# Altium footprint library HARTING THD.PcbLib: 113 footprints (part 9 of 11) (continued)
## HARTING_09 73 196 6904 [mm] "DIN 41612, Type R, 96 Position, Rows a+b+c, Performance level 2, Press-in Lead 5.0 mm, Pitch 2.54mm, Straight Male Connector" (continued)
Mechanical 14:
  circle w0.1: c2.24,-84.37 r1.4
  circle w0.1: c2.24,5.63 r1.4
  lines w0.1: -0.775,-86.87 -0.775,-84.37 0.755,-81.72 3.725,-81.72 5.255,-84.37 5.255,-86.87 ; -0.775,8.13 -0.775,5.63 0.755,2.98 3.725,2.98 5.255,5.63 5.255,8.13 ; 0.206,3.93 -2.46,3.93 ; 0.264,-82.57 -2.46,-82.57 ; 0.582,3.28 -1.81,3.28 -1.81,-81.92 0.64,-81.92 ; 3.84,-81.92 4.49,-81.92 4.49,-80.97 6.89,-80.97 6.89,2.33 4.49,2.33 4.49,3.28 3.898,3.28 ; 4.216,-82.57 5.14,-82.57 5.14,-81.62 7.54,-81.62 ; 4.274,3.93 5.14,3.93 ; -2.46,-82.57 -1.36,-81.47 ; -2.46,-82.57 -2.46,3.93 ; -2.46,3.93 -1.36,2.83 ; -1.36,-81.47 -1.36,2.83 ; -1.36,-81.47 4.04,-81.47 4.04,-80.52 6.44,-80.52 ; -1.36,2.83 4.04,2.83 ; 4.04,2.83 5.14,3.93 ; 4.04,2.83 4.04,1.88 6.44,1.88 ; 5.14,3.93 5.14,2.98 7.54,2.98 ; 6.44,-80.52 7.54,-81.62 ; 6.44,-80.52 6.44,1.88 ; 6.44,1.88 7.54,2.98 ; 7.54,-81.62 7.54,2.98 ; -3.01,-83.32 -1.835,-83.32 -1.835,-86.87 6.915,-86.87 6.915,-83.32 8.09,-83.32 8.09,4.58 6.915,4.58 6.915,8.13 -1.835,8.13 -1.835,4.58 -3.01,4.58 -3.01,-83.32
  text "1" at -4.127,-0.6 h1.2
  text "5" at -4.763,-10.76 h1.2
  text "a" at -0.343,1.387 h1.2
  text "b" at 1.245,1.387 h1.2
  text "c" at 2.832,1.387 h1.2
  text "10" at -5.715,-23.46 h1.2
  text "15" at -5.715,-36.16 h1.2
  text "20" at -5.715,-48.86 h1.2
  text "25" at -5.715,-61.56 h1.2
  text "30" at -5.715,-74.26 h1.2
  text "32" at -5.715,-79.34 h1.2
Drill Drawing:
  lines w0.1: -2.54,-58.42 -2.54,-81.28 7.62,-81.28 7.62,2.54 -2.54,2.54 -2.54,-20.32
  text "PRESS-FIT TECHNOLOGY diam. 1mm +0.1 -0" at -2.05,-55.525 h1
3D body "HARTING_09 73 196 6904.stp": height 11.6, standoff -5, extent -3.01,-86.87 8.09,8.13

## HARTING_09 73 264 6801 [mm] "Connector; DIN 41612, Har-Bus Type R, Thru-Hole; Rows a+c, 64 Position; Right Angle"
height 9.5
pads (66):
  round 1.7 hole 1: a1(0,0) a2(0,-2.54) a3(0,-5.08) a4(0,-7.62) a5(0,-10.16) a6(0,-12.7) a7(0,-15.24) a8(0,-17.78) a9(0,-20.32) a10(0,-22.86) a11(0,-25.4) a12(0,-27.94) a13(0,-30.48) a14(0,-33.02) a15(0,-35.56) a16(0,-38.1) a17(0,-40.64) a18(0,-43.18) a19(0,-45.72) a20(0,-48.26) a21(0,-50.8) a22(0,-53.34) a23(0,-55.88) a24(0,-58.42) a25(0,-60.96) a26(0,-63.5) a27(0,-66.04) a28(0,-68.58) a29(0,-71.12) a30(0,-73.66) a31(0,-76.2) a32(0,-78.74) c1(-5.08,0) c2(-5.08,-2.54) c3(-5.08,-5.08) c4(-5.08,-7.62) c5(-5.08,-10.16) c6(-5.08,-12.7) c7(-5.08,-15.24) c8(-5.08,-17.78) c9(-5.08,-20.32) c10(-5.08,-22.86) c11(-5.08,-25.4) c12(-5.08,-27.94) c13(-5.08,-30.48) c14(-5.08,-33.02) c15(-5.08,-35.56) c16(-5.08,-38.1) c17(-5.08,-40.64) c18(-5.08,-43.18) c19(-5.08,-45.72) c20(-5.08,-48.26) c21(-5.08,-50.8) c22(-5.08,-53.34) c23(-5.08,-55.88) c24(-5.08,-58.42) c25(-5.08,-60.96) c26(-5.08,-63.5) c27(-5.08,-66.04) c28(-5.08,-68.58) c29(-5.08,-71.12) c30(-5.08,-73.66) c31(-5.08,-76.2) c32(-5.08,-78.74)
  round 3.5 / inner round 3.5 / far side round 5.1 hole 2.8: MTG1(2.54,5.08) MTG2(2.54,-83.82)
Top Overlay:
  lines w0.2: 1.738,-86.32 0.01,-86.32 0.01,-81.395 1.215,-81.395 1.215,2.655 0.01,2.655 0.01,7.58 1.738,7.58 ; 3.556,-86.32 6.14,-86.32 6.14,-84.003 6.14,5.263 6.14,7.58 3.556,7.58 ; 6.14,-81.845 12.06,-81.845 ; 6.14,-80.795 6.77,-80.795 12.06,-80.795 ; 6.14,2.055 6.77,2.055 12.06,2.055 ; 6.14,3.105 12.06,3.105 ; 12.06,-81.845 12.69,-81.215 12.69,-80.165 ; 12.06,-81.845 12.06,-80.795 ; 12.06,-80.795 12.69,-80.165 ; 12.06,-80.795 12.06,2.055 ; 12.06,2.055 12.69,1.425 ; 12.06,2.055 12.06,3.105 ; 12.06,3.105 12.69,2.475 12.69,1.425 ; 12.69,-80.165 12.69,1.425
  text "5" at -6.895,-10.785 h1.2
  text "1" at -6.695,-0.725 h1.2
  text "30" at -8.12,-74.235 h1.2
  text "10" at -8.02,-23.535 h1.2
  text "32" at -8.12,-79.315 h1.2
  text "25" at -8.1,-61.6 h1.2
  text "c" at -4.58,2.04 h1.2
  text "a" at -0.6,2.04 h1.2
  text "15" at -8.02,-36.235 h1.2
  text "20" at -8.12,-48.835 h1.2
Mechanical 8:
  lines w0.1: -5.08,-39.37 12.64,-39.37 ; 5.3,-86.3 5.3,7.5
Mechanical 14:
  circle w0.1: c2.54,-83.82 r1.4
  circle w0.1: c2.54,5.08 r1.4
  lines w0.1: 1.14,-77.97 5.59,-77.97 ; 1.14,-76.97 5.59,-76.97 ; 1.14,-52.57 5.59,-52.57 ; 1.14,-51.57 5.59,-51.57 ; 1.14,-27.17 5.59,-27.17 ; 1.14,-26.17 5.59,-26.17 ; 1.14,-1.77 5.59,-1.77 ; 1.14,-0.77 5.59,-0.77 ; 1.297,5.08 2.54,5.08 ; 6.14,-81.845 12.06,-81.845 ; 6.14,-80.795 6.77,-80.795 ; 6.14,2.055 6.77,2.055 ; 6.14,3.105 12.06,3.105 ; 1.14,-81.395 1.14,2.655 ; 1.14,-81.395 4.084,-81.395 5.59,-84.003 ; 1.14,-81.395 0.01,-81.395 0.01,-86.32 6.14,-86.32 6.14,-84.003 ; 1.14,2.655 4.084,2.655 5.59,5.263 ; 1.14,2.655 0.01,2.655 0.01,7.58 6.14,7.58 6.14,5.263 ; 5.59,-84.003 5.59,-77.72 1.69,-77.72 1.69,-77.22 5.59,-77.22 5.59,-52.32 1.69,-52.32 1.69,-51.82 5.59,-51.82 5.59,-26.92 1.69,-26.92 1.69,-26.42 5.59,-26.42 5.59,-1.52 1.69,-1.52 1.69,-1.02 5.59,-1.02 5.59,5.263 ; 5.59,-84.003 6.14,-84.003 ; 5.59,5.263 6.14,5.263 ; 6.14,-84.003 6.14,5.263 ; 6.77,-80.795 12.06,-80.795 ; 6.77,-80.795 6.77,2.055 ; 6.77,2.055 12.06,2.055 ; 12.06,-81.845 12.69,-81.215 12.69,-80.165 ; 12.06,-81.845 12.06,-80.795 ; 12.06,-80.795 12.69,-80.165 ; 12.06,-80.795 12.06,2.055 ; 12.06,2.055 12.69,1.425 ; 12.06,2.055 12.06,3.105 ; 12.06,3.105 12.69,2.475 12.69,1.425 ; 12.69,-80.165 12.69,1.425
  text "5" at -6.895,-10.785 h1.2
  text "10" at -8.02,-23.535 h1.2
  text "25" at -8.1,-61.6 h1.2
  text "1" at -6.695,-0.725 h1.2
  text "32" at -8.12,-79.315 h1.2
  text "15" at -8.02,-36.235 h1.2
  text "20" at -8.12,-48.835 h1.2
  text "30" at -8.12,-74.235 h1.2
  text "c" at -4.58,2.04 h1.2
  text "a" at -0.6,2.04 h1.2
3D body "HARTING_09 73 264 6801.stp": height 9.1, standoff -3, extent -5.38,-86.37 12.74,7.63

## HARTING_09 73 296 6801 [mm] "Connector; DIN 41612, Type R, Thru-Hole; Rows a+b+c, 96 Position; Right Angle"
height 9.5
pads (98):
  round 1.7 hole 1: a1(0,0) a2(0,-2.54) a3(0,-5.08) a4(0,-7.62) a5(0,-10.16) a6(0,-12.7) a7(0,-15.24) a8(0,-17.78) a9(0,-20.32) a10(0,-22.86) a11(0,-25.4) a12(0,-27.94) a13(0,-30.48) a14(0,-33.02) a15(0,-35.56) a16(0,-38.1) a17(0,-40.64) a18(0,-43.18) a19(0,-45.72) a20(0,-48.26) a21(0,-50.8) a22(0,-53.34) a23(0,-55.88) a24(0,-58.42) a25(0,-60.96) a26(0,-63.5) a27(0,-66.04) a28(0,-68.58) a29(0,-71.12) a30(0,-73.66) a31(0,-76.2) a32(0,-78.74) b1(-2.54,0) b2(-2.54,-2.54) b3(-2.54,-5.08) b4(-2.54,-7.62) b5(-2.54,-10.16) b6(-2.54,-12.7) b7(-2.54,-15.24) b8(-2.54,-17.78) b9(-2.54,-20.32) b10(-2.54,-22.86) b11(-2.54,-25.4) b12(-2.54,-27.94) b13(-2.54,-30.48) b14(-2.54,-33.02) b15(-2.54,-35.56) b16(-2.54,-38.1) b17(-2.54,-40.64) b18(-2.54,-43.18) b19(-2.54,-45.72) b20(-2.54,-48.26) b21(-2.54,-50.8) b22(-2.54,-53.34) b23(-2.54,-55.88) b24(-2.54,-58.42) b25(-2.54,-60.96) b26(-2.54,-63.5) b27(-2.54,-66.04) b28(-2.54,-68.58) b29(-2.54,-71.12) b30(-2.54,-73.66) b31(-2.54,-76.2) b32(-2.54,-78.74) c1(-5.08,0) c2(-5.08,-2.54) c3(-5.08,-5.08) c4(-5.08,-7.62) c5(-5.08,-10.16) c6(-5.08,-12.7) c7(-5.08,-15.24) c8(-5.08,-17.78) c9(-5.08,-20.32) c10(-5.08,-22.86) c11(-5.08,-25.4) c12(-5.08,-27.94) c13(-5.08,-30.48) c14(-5.08,-33.02) c15(-5.08,-35.56) c16(-5.08,-38.1) c17(-5.08,-40.64) c18(-5.08,-43.18) c19(-5.08,-45.72) c20(-5.08,-48.26) c21(-5.08,-50.8) c22(-5.08,-53.34) c23(-5.08,-55.88) c24(-5.08,-58.42) c25(-5.08,-60.96) c26(-5.08,-63.5) c27(-5.08,-66.04) c28(-5.08,-68.58) c29(-5.08,-71.12) c30(-5.08,-73.66) c31(-5.08,-76.2) c32(-5.08,-78.74)
  round 3.5 / inner round 3.5 / far side round 5.1 hole 2.8: MTG1(2.54,5.08) MTG2(2.54,-83.82)
Top Overlay:
  lines w0.2: 1.738,-86.32 0.01,-86.32 0.01,-81.395 1.19,-81.395 1.19,2.655 0.01,2.655 0.01,7.58 1.738,7.58 ; 3.556,-86.32 6.14,-86.32 6.14,-84.003 6.14,5.263 6.14,7.58 3.556,7.58 ; 6.14,-81.845 12.06,-81.845 ; 6.14,-80.795 6.77,-80.795 12.06,-80.795 ; 6.14,2.055 6.77,2.055 12.06,2.055 ; 6.14,3.105 12.06,3.105 ; 12.06,-81.845 12.06,-80.795 ; 12.06,-81.845 12.69,-81.215 12.69,-80.165 ; 12.06,-80.795 12.06,2.055 ; 12.06,-80.795 12.69,-80.165 ; 12.06,2.055 12.06,3.105 ; 12.06,2.055 12.69,1.425 ; 12.06,3.105 12.69,2.475 12.69,1.425 ; 12.69,-80.165 12.69,1.425
  text "20" at -8.12,-48.835 h1.2
  text "15" at -8.02,-36.235 h1.2
  text "a" at -0.6,2.04 h1.2
  text "b" at -2.04,2.04 h1.2
  text "c" at -4.58,2.04 h1.2
  text "25" at -8.1,-61.6 h1.2
  text "32" at -8.12,-79.315 h1.2
  text "10" at -8.02,-23.535 h1.2
  text "30" at -8.12,-74.235 h1.2
  text "1" at -6.695,-0.725 h1.2
  text "5" at -6.895,-10.785 h1.2
Mechanical 8:
  lines w0.1: -5.08,-39.37 12.64,-39.37 ; 5.3,-86.3 5.3,7.5
Mechanical 14:
  circle w0.1: c2.54,5.08 r1.4
  circle w0.1: c2.54,-83.82 r1.4
  lines w0.1: 1.14,-77.97 5.59,-77.97 ; 1.14,-76.97 5.59,-76.97 ; 1.14,-52.57 5.59,-52.57 ; 1.14,-51.57 5.59,-51.57 ; 1.14,-27.17 5.59,-27.17 ; 1.14,-26.17 5.59,-26.17 ; 1.14,-1.77 5.59,-1.77 ; 1.14,-0.77 5.59,-0.77 ; 1.297,5.08 2.54,5.08 ; 6.14,-81.845 12.06,-81.845 ; 6.14,-80.795 6.77,-80.795 ; 6.14,2.055 6.77,2.055 ; 6.14,3.105 12.06,3.105 ; 1.14,-81.395 0.01,-81.395 0.01,-86.32 6.14,-86.32 6.14,-84.003 ; 1.14,-81.395 4.084,-81.395 5.59,-84.003 ; 1.14,-81.395 1.14,2.655 ; 1.14,2.655 0.01,2.655 0.01,7.58 6.14,7.58 6.14,5.263 ; 1.14,2.655 4.084,2.655 5.59,5.263 ; 5.59,-84.003 6.14,-84.003 ; 5.59,-84.003 5.59,-77.72 1.69,-77.72 1.69,-77.22 5.59,-77.22 5.59,-52.32 1.69,-52.32 1.69,-51.82 5.59,-51.82 5.59,-26.92 1.69,-26.92 1.69,-26.42 5.59,-26.42 5.59,-1.52 1.69,-1.52 1.69,-1.02 5.59,-1.02 5.59,5.263 ; 5.59,5.263 6.14,5.263 ; 6.14,-84.003 6.14,5.263 ; 6.77,-80.795 6.77,2.055 ; 6.77,-80.795 12.06,-80.795 ; 6.77,2.055 12.06,2.055 ; 12.06,-81.845 12.06,-80.795 ; 12.06,-81.845 12.69,-81.215 12.69,-80.165 ; 12.06,-80.795 12.06,2.055 ; 12.06,-80.795 12.69,-80.165 ; 12.06,2.055 12.06,3.105 ; 12.06,2.055 12.69,1.425 ; 12.06,3.105 12.69,2.475 12.69,1.425 ; 12.69,-80.165 12.69,1.425
  text "a" at -0.6,2.04 h1.2
  text "b" at -2.04,2.04 h1.2
  text "c" at -4.58,2.04 h1.2
  text "30" at -8.12,-74.235 h1.2
  text "20" at -8.12,-48.835 h1.2
  text "15" at -8.02,-36.235 h1.2
  text "32" at -8.12,-79.315 h1.2
  text "1" at -6.695,-0.725 h1.2
  text "25" at -8.1,-61.6 h1.2
  text "10" at -8.02,-23.535 h1.2
  text "5" at -6.895,-10.785 h1.2
3D body "HARTING_09 73 296 6801.stp": height 9.1, standoff -3, extent -5.38,-86.37 12.74,7.63

## HARTING_09 73 296 6801_a [mm] "Connector; DIN 41612, Type R, Thru-Hole; Rows a+b+c, 96 Position; Right Angle"
height 9.5
pads (98):
  round 1.7 hole 1: a1(0,0) a2(0,-2.54) a3(0,-5.08) a4(0,-7.62) a5(0,-10.16) a6(0,-12.7) a7(0,-15.24) a8(0,-17.78) a9(0,-20.32) a10(0,-22.86) a11(0,-25.4) a12(0,-27.94) a13(0,-30.48) a14(0,-33.02) a15(0,-35.56) a16(0,-38.1) a17(0,-40.64) a18(0,-43.18) a19(0,-45.72) a20(0,-48.26) a21(0,-50.8) a22(0,-53.34) a23(0,-55.88) a24(0,-58.42) a25(0,-60.96) a26(0,-63.5) a27(0,-66.04) a28(0,-68.58) a29(0,-71.12) a30(0,-73.66) a31(0,-76.2) a32(0,-78.74) b1(2.54,0) b2(2.54,-2.54) b3(2.54,-5.08) b4(2.54,-7.62) b5(2.54,-10.16) b6(2.54,-12.7) b7(2.54,-15.24) b8(2.54,-17.78) b9(2.54,-20.32) b10(2.54,-22.86) b11(2.54,-25.4) b12(2.54,-27.94) b13(2.54,-30.48) b14(2.54,-33.02) b15(2.54,-35.56) b16(2.54,-38.1) b17(2.54,-40.64) b18(2.54,-43.18) b19(2.54,-45.72) b20(2.54,-48.26) b21(2.54,-50.8) b22(2.54,-53.34) b23(2.54,-55.88) b24(2.54,-58.42) b25(2.54,-60.96) b26(2.54,-63.5) b27(2.54,-66.04) b28(2.54,-68.58) b29(2.54,-71.12) b30(2.54,-73.66) b31(2.54,-76.2) b32(2.54,-78.74) c1(5.08,0) c2(5.08,-2.54) c3(5.08,-5.08) c4(5.08,-7.62) c5(5.08,-10.16) c6(5.08,-12.7) c7(5.08,-15.24) c8(5.08,-17.78) c9(5.08,-20.32) c10(5.08,-22.86) c11(5.08,-25.4) c12(5.08,-27.94) c13(5.08,-30.48) c14(5.08,-33.02) c15(5.08,-35.56) c16(5.08,-38.1) c17(5.08,-40.64) c18(5.08,-43.18) c19(5.08,-45.72) c20(5.08,-48.26) c21(5.08,-50.8) c22(5.08,-53.34) c23(5.08,-55.88) c24(5.08,-58.42) c25(5.08,-60.96) c26(5.08,-63.5) c27(5.08,-66.04) c28(5.08,-68.58) c29(5.08,-71.12) c30(5.08,-73.66) c31(5.08,-76.2) c32(5.08,-78.74)
  round 3.5 / inner round 3.5 / far side round 5.1 hole 2.8: MTG1(-2.54,5.08) MTG2(-2.54,-83.82)
Top Overlay:
  lines w0.2: -6.14,-81.845 -12.06,-81.845 ; -6.14,-80.795 -6.77,-80.795 -12.06,-80.795 ; -6.14,2.055 -6.77,2.055 -12.06,2.055 ; -6.14,3.105 -12.06,3.105 ; -3.556,-86.32 -6.14,-86.32 -6.14,-84.003 -6.14,5.263 -6.14,7.58 -3.556,7.58 ; -1.738,-86.32 -0.01,-86.32 -0.01,-81.395 -1.19,-81.395 -1.19,2.655 -0.01,2.655 -0.01,7.58 -1.738,7.58 ; -12.69,-80.165 -12.69,1.425 ; -12.69,-80.165 -12.69,-81.215 -12.06,-81.845 ; -12.69,-80.165 -12.06,-80.795 ; -12.69,1.425 -12.69,2.475 -12.06,3.105 ; -12.69,1.425 -12.06,2.055 ; -12.06,-81.845 -12.06,-80.795 ; -12.06,-80.795 -12.06,2.055 ; -12.06,2.055 -12.06,3.105
  text "20" at 6.38,-48.835 h1.2
  text "15" at 6.48,-36.235 h1.2
  text "25" at 6.4,-61.6 h1.2
  text "32" at 6.38,-79.315 h1.2
  text "10" at 6.48,-23.535 h1.2
  text "30" at 6.38,-74.235 h1.2
  text "1" at 6.705,-0.725 h1.2
  text "5" at 6.505,-10.785 h1.2
  text "c" at 5.6,1.72 h1.2
  text "b" at 3.66,1.72 h1.2
  text "a" at 1.42,1.72 h1.2
Mechanical 8:
  lines w0.1: -12.64,-39.37 5.08,-39.37 ; -5.3,-86.24 -5.3,7.56
  text "Reversed Numbering Version" at -8.4,-71.4 h2.5
Mechanical 14:
  circle w0.1: c-2.54,5.08 r1.4
  circle w0.1: c-2.54,-83.82 r1.4
  lines w0.1: -6.14,-81.845 -12.06,-81.845 ; -6.14,-80.795 -6.77,-80.795 ; -6.14,2.055 -6.77,2.055 ; -6.14,3.105 -12.06,3.105 ; -5.59,-77.97 -1.14,-77.97 ; -5.59,-76.97 -1.14,-76.97 ; -5.59,-52.57 -1.14,-52.57 ; -5.59,-51.57 -1.14,-51.57 ; -5.59,-27.17 -1.14,-27.17 ; -5.59,-26.17 -1.14,-26.17 ; -5.59,-1.77 -1.14,-1.77 ; -5.59,-0.77 -1.14,-0.77 ; -2.54,-83.82 -1.297,-83.82 ; -12.69,-80.165 -12.69,1.425 ; -12.69,-80.165 -12.69,-81.215 -12.06,-81.845 ; -12.69,-80.165 -12.06,-80.795 ; -12.69,1.425 -12.69,2.475 -12.06,3.105 ; -12.69,1.425 -12.06,2.055 ; -12.06,-81.845 -12.06,-80.795 ; -12.06,-80.795 -6.77,-80.795 ; -12.06,-80.795 -12.06,2.055 ; -12.06,2.055 -6.77,2.055 ; -12.06,2.055 -12.06,3.105 ; -6.77,-80.795 -6.77,2.055 ; -6.14,-84.003 -6.14,5.263 ; -6.14,-84.003 -5.59,-84.003 ; -6.14,-84.003 -6.14,-86.32 -0.01,-86.32 -0.01,-81.395 -1.14,-81.395 ; -6.14,5.263 -5.59,5.263 ; -6.14,5.263 -6.14,7.58 -0.01,7.58 -0.01,2.655 -1.14,2.655 ; -5.59,-84.003 -5.59,-77.72 -1.69,-77.72 -1.69,-77.22 -5.59,-77.22 -5.59,-52.32 -1.69,-52.32 -1.69,-51.82 -5.59,-51.82 -5.59,-26.92 -1.69,-26.92 -1.69,-26.42 -5.59,-26.42 -5.59,-1.52 -1.69,-1.52 -1.69,-1.02 -5.59,-1.02 -5.59,5.263 ; -5.59,-84.003 -4.084,-81.395 -1.14,-81.395 ; -5.59,5.263 -4.084,2.655 -1.14,2.655 ; -1.14,-81.395 -1.14,2.655
  text "30" at 6.38,-74.235 h1.2
  text "20" at 6.38,-48.835 h1.2
  text "15" at 6.48,-36.235 h1.2
  text "32" at 6.38,-79.315 h1.2
  text "1" at 6.705,-0.725 h1.2
  text "25" at 6.4,-61.6 h1.2
  text "10" at 6.48,-23.535 h1.2
  text "5" at 6.505,-10.785 h1.2
  text "c" at 5.6,1.72 h1.2
  text "b" at 3.66,1.72 h1.2
  text "a" at 1.42,1.72 h1.2
3D body "HARTING_09 73 296 6801.stp": height 9.1, standoff -3, extent -12.74,-86.37 5.38,7.63

## HARTING_09 79 196 6903 [mm] "DIN 41612, Type RL, 96 Position, Rows a+b+c, Performance level 2, Straight Male Connector, Lead 4.0 mm, Pitch 2.54mm"
height 11.6
pads (98):
  round 1.7 hole 1: a1(0,0) a2(0,-2.54) a3(0,-5.08) a4(0,-7.62) a5(0,-10.16) a6(0,-12.7) a7(0,-15.24) a8(0,-17.78) a9(0,-20.32) a10(0,-22.86) a11(0,-25.4) a12(0,-27.94) a13(0,-30.48) a14(0,-33.02) a15(0,-35.56) a16(0,-38.1) a17(0,-40.64) a18(0,-43.18) a19(0,-45.72) a20(0,-48.26) a21(0,-50.8) a22(0,-53.34) a23(0,-55.88) a24(0,-58.42) a25(0,-60.96) a26(0,-63.5) a27(0,-66.04) a28(0,-68.58) a29(0,-71.12) a30(0,-73.66) a31(0,-76.2) a32(0,-78.74) b1(2.54,0) b2(2.54,-2.54) b3(2.54,-5.08) b4(2.54,-7.62) b5(2.54,-10.16) b6(2.54,-12.7) b7(2.54,-15.24) b8(2.54,-17.78) b9(2.54,-20.32) b10(2.54,-22.86) b11(2.54,-25.4) b12(2.54,-27.94) b13(2.54,-30.48) b14(2.54,-33.02) b15(2.54,-35.56) b16(2.54,-38.1) b17(2.54,-40.64) b18(2.54,-43.18) b19(2.54,-45.72) b20(2.54,-48.26) b21(2.54,-50.8) b22(2.54,-53.34) b23(2.54,-55.88) b24(2.54,-58.42) b25(2.54,-60.96) b26(2.54,-63.5) b27(2.54,-66.04) b28(2.54,-68.58) b29(2.54,-71.12) b30(2.54,-73.66) b31(2.54,-76.2) b32(2.54,-78.74) c1(5.08,0) c2(5.08,-2.54) c3(5.08,-5.08) c4(5.08,-7.62) c5(5.08,-10.16) c6(5.08,-12.7) c7(5.08,-15.24) c8(5.08,-17.78) c9(5.08,-20.32) c10(5.08,-22.86) c11(5.08,-25.4) c12(5.08,-27.94) c13(5.08,-30.48) c14(5.08,-33.02) c15(5.08,-35.56) c16(5.08,-38.1) c17(5.08,-40.64) c18(5.08,-43.18) c19(5.08,-45.72) c20(5.08,-48.26) c21(5.08,-50.8) c22(5.08,-53.34) c23(5.08,-55.88) c24(5.08,-58.42) c25(5.08,-60.96) c26(5.08,-63.5) c27(5.08,-66.04) c28(5.08,-68.58) c29(5.08,-71.12) c30(5.08,-73.66) c31(5.08,-76.2) c32(5.08,-78.74)
  round 3.5 / inner round 3.5 / far side round 5.1 hole 2.8: MTG1(1.81,5.63) MTG2(1.81,-84.37)
Top Overlay:
  lines w0.2: -1.835,-83.32 -1.835,-86.87 0.152,-86.87 ; -1.835,4.58 -1.835,8.13 0.152,8.13 ; -1.36,-79.484 -1.36,-81.47 ; -1.36,0.744 -1.36,2.83 ; -1,-83.32 -3.01,-83.32 -3.01,4.58 -1,4.58 ; -0.89,-86.87 -0.89,-85.678 ; -0.89,-83.062 -0.89,-81.92 ; -0.89,-82.57 -2.46,-82.57 ; -0.89,3.28 -0.89,4.322 ; -0.89,3.93 -2.46,3.93 ; -0.89,6.938 -0.89,8.13 ; -0.055,3.28 -1.81,3.28 -1.81,-81.92 0.079,-81.92 ; 0.733,2.83 -1.36,2.83 ; 1.042,-81.47 -1.36,-81.47 ; 2.578,-81.47 4.06,-81.47 ; 2.887,2.83 4.06,2.83 ; 3.468,-86.87 6.915,-86.87 6.915,-83.32 ; 3.468,8.13 6.915,8.13 6.915,4.58 ; 3.541,-81.92 4.51,-81.92 4.06,-81.47 ; 3.675,3.28 4.51,3.28 4.06,2.83 ; 4.51,-86.87 4.51,-85.678 ; 4.51,-83.062 4.51,-80.97 ; 4.51,-81.62 7.54,-81.62 ; 4.51,2.98 7.54,2.98 ; 4.51,4.322 4.51,2.33 ; 4.51,6.938 4.51,8.13 ; 4.62,-83.32 8.09,-83.32 8.09,4.58 4.62,4.58 ; 6.44,-79.484 6.44,-80.52 ; 6.44,0.744 6.44,1.88 ; -2.46,-82.57 -1.36,-81.47 ; -2.46,-82.57 -2.46,3.93 ; -2.46,3.93 -1.36,2.83 ; 4.06,-81.47 4.06,-80.52 ; 4.06,-80.52 4.51,-80.97 ; 4.06,-80.52 6.44,-80.52 ; 4.06,1.88 4.51,2.33 ; 4.06,1.88 6.44,1.88 ; 4.06,1.88 4.06,2.83 ; 4.51,-80.97 6.89,-80.97 6.89,2.33 4.51,2.33 ; 6.44,-80.52 7.54,-81.62 ; 6.44,1.88 7.54,2.98 ; 7.54,-81.62 7.54,2.98
  text "1" at -4.127,-0.6 h1.2
  text "5" at -4.763,-10.76 h1.2
  text "a" at -0.318,1.587 h1.2
  text "b" at 1.27,1.587 h1.2
  text "c" at 2.857,1.587 h1.2
  text "10" at -5.715,-23.46 h1.2
  text "15" at -5.715,-36.16 h1.2
  text "20" at -5.715,-48.86 h1.2
  text "25" at -5.715,-61.56 h1.2
  text "30" at -5.715,-74.26 h1.2
  text "32" at -5.715,-79.34 h1.2
Mechanical 8:
  drawing of 400 lines, arcs and shapes, not listed
Mechanical 14:
  circle w0.1: c1.81,-84.37 r1.4
  circle w0.1: c1.81,5.63 r1.4
  lines w0.1: -1.835,-83.32 -1.835,-86.87 6.915,-86.87 6.915,-83.32 ; -1.835,4.58 -1.835,8.13 6.915,8.13 6.915,4.58 ; -0.89,-86.87 -0.89,-81.92 ; -0.89,-83.32 -3.01,-83.32 -3.01,4.58 -0.89,4.58 ; -0.89,-82.82 0.288,-82.82 cw(c1.81,-84.74) 3.332,-82.82 4.51,-82.82 ; -0.89,-82.57 -2.46,-82.57 ; -0.89,3.28 -0.89,8.13 ; -0.89,3.93 -2.46,3.93 ; -0.89,4.08 0.288,4.08 ccw(c1.81,6) 3.332,4.08 4.51,4.08 ; 4.51,-86.87 4.51,-80.97 ; 4.51,-83.32 8.09,-83.32 8.09,4.58 4.51,4.58 ; 4.51,-81.62 7.54,-81.62 ; 4.51,2.98 7.54,2.98 ; 4.51,8.13 4.51,2.33 ; -2.46,-82.57 -1.36,-81.47 ; -2.46,-82.57 -2.46,3.93 ; -2.46,3.93 -1.36,2.83 ; -1.36,-81.47 -1.36,2.83 ; -1.36,-81.47 4.06,-81.47 ; -1.36,2.83 4.06,2.83 ; 4.06,-81.47 4.51,-81.92 -1.81,-81.92 -1.81,3.28 4.51,3.28 4.06,2.83 ; 4.06,-81.47 4.06,-80.52 ; 4.06,-80.52 4.51,-80.97 ; 4.06,-80.52 6.44,-80.52 ; 4.06,1.88 4.51,2.33 ; 4.06,1.88 6.44,1.88 ; 4.06,1.88 4.06,2.83 ; 4.51,-80.97 6.89,-80.97 6.89,2.33 4.51,2.33 ; 6.44,-80.52 7.54,-81.62 ; 6.44,-80.52 6.44,1.88 ; 6.44,1.88 7.54,2.98 ; 7.54,-81.62 7.54,2.98
  text "32" at -5.715,-79.34 h1.2
  text "30" at -5.715,-74.26 h1.2
  text "25" at -5.715,-61.56 h1.2
  text "20" at -5.715,-48.86 h1.2
  text "15" at -5.715,-36.16 h1.2
  text "10" at -5.715,-23.46 h1.2
  text "c" at 2.857,1.587 h1.2
  text "b" at 1.27,1.587 h1.2
  text "a" at -0.318,1.587 h1.2
  text "5" at -4.763,-10.76 h1.2
  text "1" at -4.127,-0.6 h1.2
3D body "HARTING_09 79 196 6903.stp": height 11.6, standoff -2.5, extent -3.01,-86.87 8.09,8.13

## HARTING_16 11 170 5202 000 [mm] "170 Poles, Press-Fit, AdvancedMC Connector for MicroTCA"
height 12.9
pads (172):
  round 1.15 hole 0.55: 1(31.225,-3.025) 2(31.025,-1.525) 3(29.725,-3.025) 4(29.525,-1.525) 5(28.225,-3.025) 6(28.025,-1.525) 7(28.025,-0.025) 8(25.975,-3.025) 9(25.775,-1.525) 10(25.775,-0.025) 11(23.725,-3.025) 12(23.525,-1.525) 13(23.525,-0.025) 14(21.475,-3.025) 15(21.275,-1.525) 16(21.275,-0.025) 17(19.225,-3.025) 18(19.025,-1.525) 19(19.025,-0.025) 20(16.975,-3.025) 21(16.775,-1.525) 22(16.775,-0.025) 23(14.725,-3.025) 24(14.525,-1.525) 25(14.525,-0.025) 26(12.475,-3.025) 27(12.275,-1.525) 28(12.275,-0.025) 29(10.225,-3.025) 30(10.025,-1.525) 31(10.025,-0.025) 32(7.975,-3.025) 33(7.775,-1.525) 34(7.775,-0.025) 35(5.725,-3.025) 36(5.525,-1.525) 37(5.525,-0.025) 38(3.475,-3.025) 39(3.275,-1.525) 40(3.275,-0.025) 41(1.225,-3.025) 42(1.025,-1.525) 43(1.025,-0.025) 44(-1.025,-3.025) 45(-1.225,-1.525) 46(-1.225,-0.025) 47(-3.275,-3.025) 48(-3.475,-1.525) 49(-3.475,-0.025) 50(-5.525,-3.025) 51(-5.725,-1.525) 52(-5.725,-0.025) 53(-7.775,-3.025) 54(-7.975,-1.525) 55(-7.975,-0.025) 56(-10.025,-3.025) 57(-10.225,-1.525) 58(-10.225,-0.025) 59(-12.275,-3.025) 60(-12.475,-1.525) 61(-12.475,-0.025) 62(-14.525,-3.025) 63(-14.725,-1.525) 64(-14.725,-0.025) 65(-16.775,-3.025) 66(-16.975,-1.525) 67(-16.975,-0.025) 68(-19.025,-3.025) 69(-19.225,-1.525) 70(-19.225,-0.025) 71(-21.275,-3.025) 72(-21.475,-1.525) 73(-21.475,-0.025) 74(-23.525,-3.025) 75(-23.725,-1.525) 76(-23.725,-0.025) 77(-25.775,-3.025) 78(-25.975,-1.525) 79(-25.975,-0.025) 80(-28.025,-3.025) 81(-28.225,-1.525) 82(-28.225,-0.025) 83(-30.275,-3.025) 84(-30.475,-1.525) 85(-30.475,-0.025) 87(-30.475,2.975) 88(-30.275,1.475) 90(-28.225,2.975) 91(-28.025,1.475) 93(-25.975,2.975) 94(-25.775,1.475) 96(-23.725,2.975) 97(-23.525,1.475) 99(-21.475,2.975) 100(-21.275,1.475) 102(-19.225,2.975) 103(-19.025,1.475) 105(-16.975,2.975) 106(-16.775,1.475) 108(-14.725,2.975) 109(-14.525,1.475) 111(-12.475,2.975) 112(-12.275,1.475) 114(-10.225,2.975) 115(-10.025,1.475) 117(-7.975,2.975) 118(-7.775,1.475) 120(-5.725,2.975) 121(-5.525,1.475) 123(-3.475,2.975) 124(-3.275,1.475) 126(-1.225,2.975) 127(-1.025,1.475) 129(1.025,2.975) 130(1.225,1.475) 132(3.275,2.975) 133(3.475,1.475) 135(5.525,2.975) 136(5.725,1.475) 138(7.775,2.975) 139(7.975,1.475) 141(10.025,2.975) 142(10.225,1.475) 144(12.275,2.975) 145(12.475,1.475) 147(14.525,2.975) 148(14.725,1.475) 150(16.775,2.975) 151(16.975,1.475) 153(19.025,2.975) 154(19.225,1.475) 156(21.275,2.975) 157(21.475,1.475) 159(23.525,2.975) 160(23.725,1.475) 162(25.775,2.975) 163(25.975,1.475) 165(28.025,2.975) 166(28.225,1.475) 167(29.525,2.975) 168(29.725,1.475) 169(31.025,2.975) 170(31.225,1.475)
  round 0.9 smd paste-0.46 mask-0.46: 86(-30.475,-0.025) 89(-28.225,-0.025) 92(-25.975,-0.025) 95(-23.725,-0.025) 98(-21.475,-0.025) 101(-19.225,-0.025) 104(-16.975,-0.025) 107(-14.725,-0.025) 110(-12.475,-0.025) 113(-10.225,-0.025) 116(-7.975,-0.025) 119(-5.725,-0.025) 122(-3.475,-0.025) 125(-1.225,-0.025) 128(1.025,-0.025) 131(3.275,-0.025) 134(5.525,-0.025) 137(7.775,-0.025) 140(10.025,-0.025) 143(12.275,-0.025) 146(14.525,-0.025) 149(16.775,-0.025) 152(19.025,-0.025) 155(21.275,-0.025) 158(23.525,-0.025) 161(25.775,-0.025) 164(28.025,-0.025)
  round 1 hole 2.4 unplated mask+0.7: 171(-34.65,-1.375) 172(34.65,0)
Top Overlay:
  lines w0.2: -35.9,-0.376 -35.9,0.425 -33.65,0.425 -33.65,1.925 ; -35.9,0.375 -32.13,0.375 -32.13,-0.425 -33.363,-0.425 ; -33.167,-1.975 -31.424,-1.975 ; -32.65,-0.425 -32.65,-0.975 -31.369,-0.975 ; -32.65,0.375 -32.65,0.925 ; -31.235,3.7 -37.4,3.7 -37.4,-3.75 -31.035,-3.75 ; -31.224,1.925 -33.65,1.925 ; -31.169,0.925 -32.65,0.925 ; 31.785,3.7 37.4,3.7 37.4,-2.75 36.4,-3.75 31.985,-3.75 ; 31.919,-0.975 32.5,-0.975 ; 31.974,-1.975 33.5,-1.975 ; 32.119,0.925 32.5,0.925 ; 32.174,1.925 33.5,1.925 ; 33.5,-1.112 33.5,-1.975 ; 33.5,1.112 33.5,1.925 ; -33.65,1.925 -32.65,0.925 ; 32.5,-0.975 32.5,0.925 ; 32.5,-0.975 33.5,-1.975 ; 32.5,0.925 33.5,1.925 ; 35.4,-1.95 35.65,-2.75 35.9,-1.95 35.4,-1.95
Mechanical 8:
  drawing of 584 lines, arcs and shapes, not listed
Mechanical 14:
  lines w0.1: -35.9,-0.425 -32.13,-0.425 -32.13,0.375 -35.9,0.375 ; -32.65,-0.425 -32.65,-0.975 32.5,-0.975 ; -32.65,0.375 -32.65,0.925 ; -33.65,1.925 -33.65,0.425 -35.9,0.425 -35.9,-0.475 -33.65,-0.475 -33.65,-1.975 33.5,-1.975 ; -33.65,1.925 33.5,1.925 ; -33.65,1.925 -32.65,0.925 ; -32.65,0.925 32.5,0.925 ; 32.5,-0.975 32.5,0.925 ; 32.5,-0.975 33.5,-1.975 ; 32.5,0.925 33.5,1.925 ; 33.5,-1.975 33.5,1.925 ; -37.4,-3.75 -37.4,3.7 37.4,3.7 37.4,-2.75 36.4,-3.75 -37.4,-3.75 ; 35.4,-1.95 35.65,-2.75 35.9,-1.95 35.4,-1.95
  text "169" at 32.1,2.3 h1
  text "87" at -33.1,2.4 h1
  text "83" at -33.1,-3.4 h1
  text "1" at 32.3,-3.4 h1
Drill Drawing:
  lines w0.1: -31.6,-4.2 -31.6,4.2 32.3,4.2 32.3,-4.2 -31.6,-4.2
  text "diam. 0.55mm +/- 0.05" at -8.3,-5.8 h1
  text "PRESS-FIT TECHNOLOGY" at -7.55,4.75 h1
3D body "HARTING_16 11 170 5202 000.stp": height 12.85, standoff -2.1, extent -37.4,-3.75 37.4,3.7